# Altium footprint library DrPCB.PcbLib: 910 footprints (part 35 of 57)
Each footprint in its own frame and in the unit in brackets; x right, y up, seen from the top. Pads: shape width x height; smd on the part's side, far side on the other; paste and mask are expansions set on the pad; w line width, h text height; cw(c..) or ccw(c..) is an arc to the next point about the centre after c.
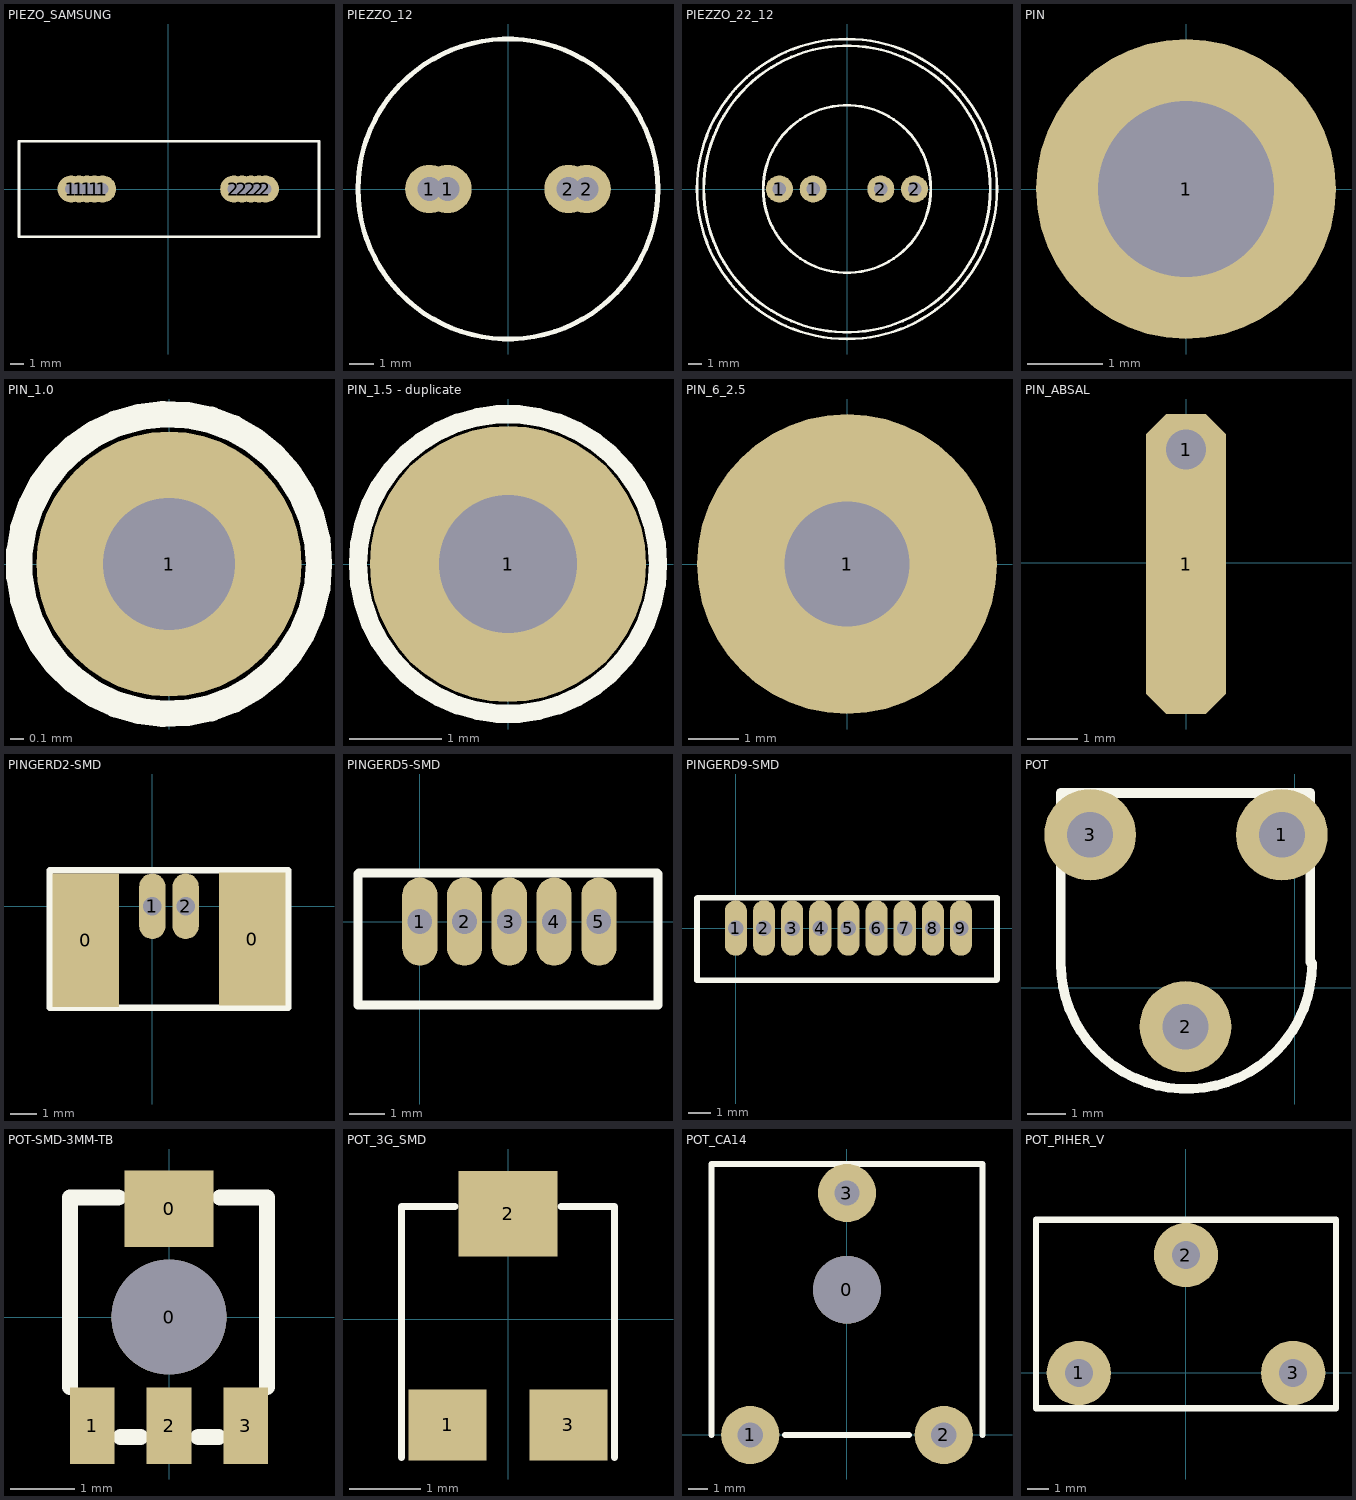
[diagram p34: the footprints below, top view; thin cyan lines are the x and y axes]

## PIEZO_SAMSUNG [mm]
pads (10):
  round 2 hole 0.9: 1(-7.118,0) 1(-6.546,0) 1(-5.949,0) 1(-5.403,0) 1(-4.832,0) 2(4.806,0) 2(5.416,0) 2(6.051,0) 2(6.635,0) 2(7.118,0)
Top Overlay:
  lines w0.2: -10.949,-3.5 11.051,-3.5 11.051,3.5 -10.949,3.5 -10.949,-3.5
3D body: height 22, standoff 0, extent -10.949,-3.5 11.051,3.5
3D body: height 11, standoff 0, extent -10.949,-3.5 11.051,3.5

## PIEZZO_12 [mm] "BUZZER, BUZZER 22mm DIA,"
pads (4):
  round 2 hole 1: 1(-3.25,0) 1(-2.5,0) 2(2.5,0) 2(3.25,0)
Top Overlay:
  circle w0.2: c0,0 r6.2
3D body "Buzzer.step": height 8.5, standoff -5.5, extent -6,-6 6,6

## PIEZZO_22_12 [mm] "BUZZER, BUZZER 22mm DIA,"
pads (4):
  round 2 hole 1: 1(-5,0) 1(-2.5,0) 2(2.5,0) 2(5,0)
Top Overlay:
  circle w0.2: c0,0 r11.1
  circle w0.2: c0,0 r10.6
  circle w0.2: c0,0 r6.2
3D body "User Library-PKM22EPP-4001.step": height 8.9, standoff -1.8, extent -11,-11 11,11

## PIN [mm]
pads (1):
  round 4 hole 2.35: 1(0,0)

## PIN_1.0 [mm]
pads (1):
  round 2 hole 1: 1(0,0)
Top Overlay:
  circle w0.2: c0,0 r1.133

## PIN_1.5 - duplicate [mm]
pads (1):
  round 3 hole 1.5: 1(0,0)
Top Overlay:
  circle w0.2: c0,0 r1.628

## PIN_6_2.5 [mm]
pads (1):
  round 6 hole 2.5: 1(0,0)

## PIN_ABSAL [mm]
pads (2):
  oct 1.6x6 all layers, no hole: 1(0,-0.025)
  round 0.8 hole 0.8: 1(0,2.261)

## PINGERD2-SMD [mm]
pads (4):
  rect 2.54x5.08 smd: 0(-2.54,-1.295) 0(3.81,-1.245)
  oval 1x2.5 hole 0.7: 1(0,0) 2(1.27,0)
Top Overlay:
  lines w0.254: -3.912,1.346 -3.912,-3.861 5.182,-3.861 5.182,1.372 -3.912,1.372

## PINGERD5-SMD [mm]
pads (5):
  oval 1x2.5 hole 0.7: 1(0,0) 2(1.27,0) 3(2.54,0) 4(3.81,0) 5(5.08,0)
Top Overlay:
  lines w0.254: -1.753,-2.362 -1.753,1.346 ; -1.727,-2.362 6.756,-2.362 6.756,1.346 ; -1.727,1.372 6.731,1.372

## PINGERD9-SMD [mm]
pads (9):
  oval 1x2.5 hole 0.7: 1(0,0) 2(1.27,0) 3(2.54,0) 4(3.81,0) 5(5.08,0) 6(6.35,0) 7(7.62,0) 8(8.89,0) 9(10.16,0)
Top Overlay:
  lines w0.254: -1.753,-2.362 -1.753,1.346 ; -1.727,-2.362 11.76,-2.362 ; -1.727,1.372 11.786,1.372 11.786,-2.311

## POT [mil]
pads (3):
  round 94 hole 47: 1(-13,157) 2(-112,-40) 3(-210,157)
Top Overlay:
  lines w10: 16,26 16,200 -240,200 -240,25 ccw(c-111,25) 18,25

## POT-SMD-3MM-TB [mm]
pads (5):
  round 1.8 hole 1.8: 0(0,0)
  rect 1.4x1.2 smd: 0(0,1.7)
  rect 0.7x1.2 smd: 1(-1.2,-1.7) 2(0,-1.7) 3(1.2,-1.7)
Top Overlay:
  lines w0.254: -1.549,-1.092 -1.549,1.875 -0.797,1.875 ; -0.762,-1.875 -0.445,-1.875 ; 0.457,-1.875 0.775,-1.875 ; 0.8,1.875 1.537,1.875 1.537,-1.092

## POT_3G_SMD [mm]
pads (3):
  rect 1.1x1 smd: 1(-0.85,-1.487) 3(0.85,-1.487)
  rect 1.4x1.2 smd: 2(0,1.488)
Top Overlay:
  lines w0.1: -1.5,-1.943 -1.5,1.587 -0.749,1.587 ; 0.749,1.587 1.5,1.587 1.5,-1.943
3D body "TC33X-2-103G--3DModel-STEP-1.STEP": height 1.21, standoff 0.01, extent -1.5,-1.9 1.5,1.9

## POT_CA14 [mm]
pads (4):
  round 3.5 hole 3.5: 0(0,7.5)
  round 3 hole 1.3: 1(-5,0) 2(5,0) 3(0,12.5)
Top Overlay:
  lines w0.3: -7,0 -7,14 7,14 7,0 ; -3.2,0 3.2,0

## POT_PIHER_V [mm]
pads (3):
  round 3 hole 1.3: 1(-5,0) 2(0,5.5) 3(5,0)
Top Overlay:
  lines w0.3: -7,7.112 -7,-1.651 7,-1.651 ; -7,7.15 7,7.15 7,-1.613